# Altium integrated library CB3-ECB.IntLib: 66 symbols
Pins are listed as number, name and electrical type; pins without a type are passive.

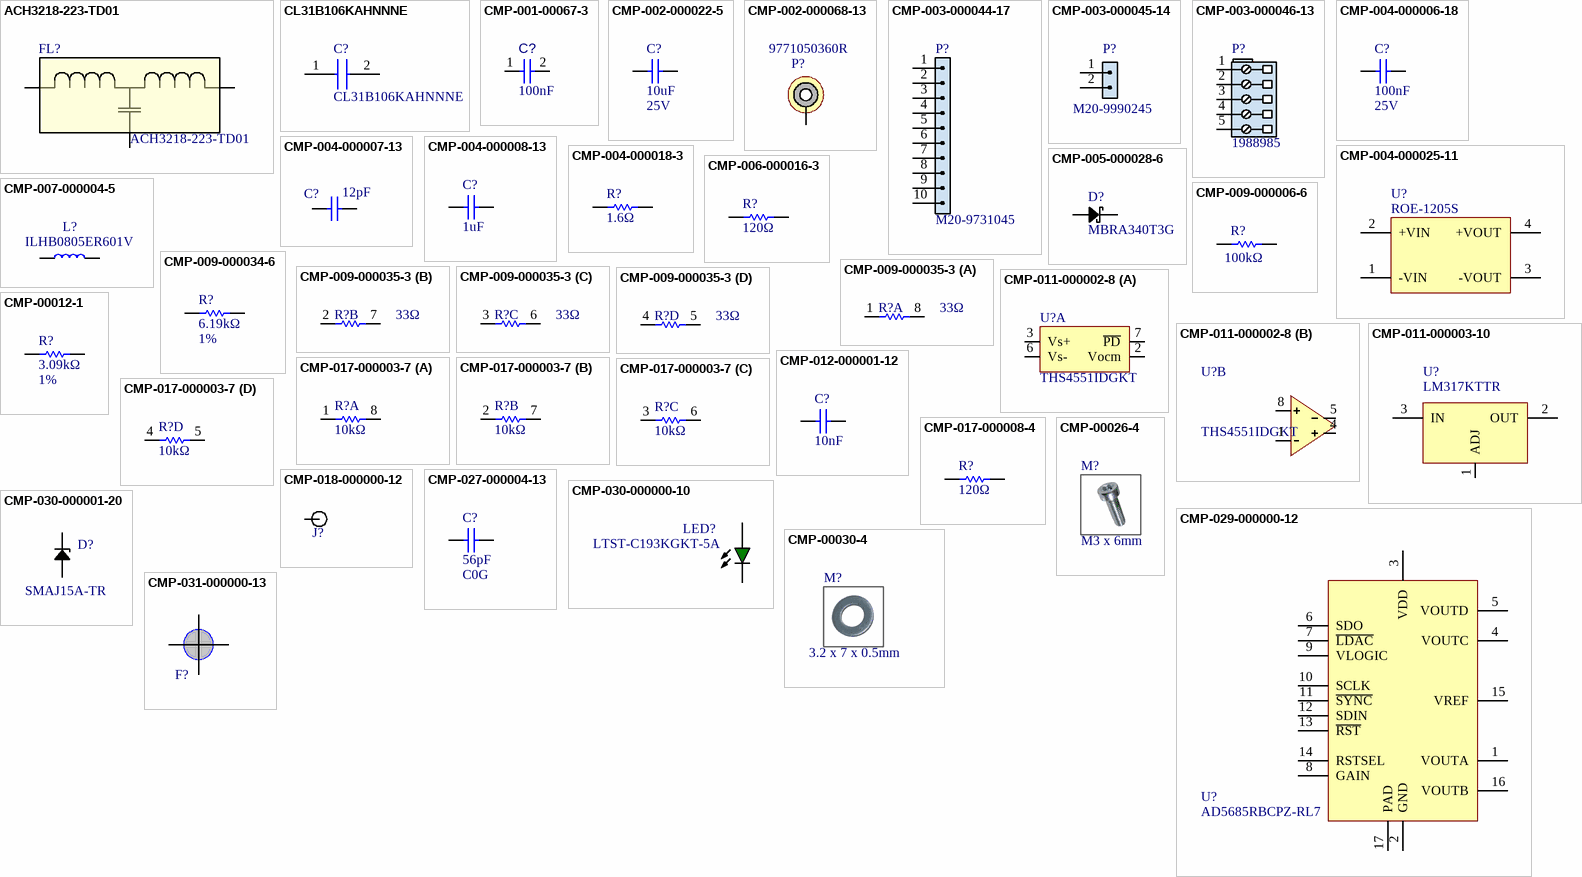
[diagram p0: symbols ACH3218-223-TD01 to CMP-031-000000-13]

## ACH3218-223-TD01
designator FL?
No Description Available; Mfr_Name: TDK
footprint CAP_TDK_ACH3218_TDK
pins: 1, 2 3, 3 2

## CL31B106KAHNNNE
designator C?
Capacitor; Manufacturer_Name: SAMSUNG; Datasheet Link: https://datasheet.datasheetarchive.com/originals/distributors/Datasheets_SAMA/d94547340e0e9d2be5f415b64e4e2f0a.pdf; Height: 1.8mm; Manufacturer_Part_Number: CL31B106KAHNNNE; Mouser Part Number: 187-CL31B106KAHNNNE; Mouser Price/Stock: https://www.mouser.co.uk/ProductDetail/Samsung-Electro-Mechanics/CL31B106KAHNNNE?qs=349EhDEZ59r5EZhnLOTsYA%3D%3D; Arrow Part Number: CL31B106KAHNNNE; Arrow Price/Stock: https://www.arrow.com/en/products/cl31b106kahnnne/samsung-electro-mechanics?region=nac
footprint CAPC3216X180N
pins: 1, 2

## CMP-001-00067-3
designator C?, comment value 100nF  (hidden comment: Capacitor 100nF +/-20% 50V 0402)
Chip Capacitor, 100nF +/-20%, 50V, 0402, Thickness 0.6 mm; Manufacturer: Murata; Manufacturer Part Number: GRM155R61H104JE14D; Manufacturer: Taiyo Yuden; Manufacturer Part Number: UMK105B7104KV-FR; Manufacturer: TDK; Manufacturer Part Number: C1005X7R1H104K; Manufacturer: Yageo; Manufacturer Part Number: CC0402KRX7R9BB104; Manufacturer Part Number: C1005X6S1H104K050BB; Manufacturer Part Number: CC0402KRX5R9BB104; Manufacturer Part Number: C1005X7R1H104K050BB; Manufacturer Part Number: GRM155R71H104KE14D; Manufacturer: Kyocera AVX; Manufacturer Part Number: 04025D104KAT2A; Manufacturer Part Number: GCM155L81E104KE02D; Manufacturer Part Number: C1005X5R1H104K; Tolerance: 10%; Min Operating Temperature: -55°C; Pins: 2; Case/Package: 0402; Max Operating Temperature: 85°C; Voltage Rating: 50V; Mounting Technology: SMT; Component Type: Capacitors
footprint CAPC0402(1005)60_L (Chip Capacitor, Body 1.0x0.5mm, Height 0.6mm, IPC High Density)
pins: 1, 2

## CMP-002-000022-5
designator C?, comment value 10uF  Voltage Rating (DC): 25V  (hidden comment: CAP-10UF-25V-X5R-1206-10%)
CAP CER 10UF 25V X5R 1206 10% (Generic Imperix Component); Tolerance: 10%; Dielectric: X5R; Case/Package: 1206
footprint CAPC3216L(1206) (General 1206 Capacitor Footprint, Body 3.2x1.6mm, IPC High Density)
pins: 1, 2

## CMP-002-000068-13
designator P?, comment 9771050360R
WA-SMSE SMT Steel Spacer, M3x5mm Thread External; Thread Size: M3; Threaded/Unthreaded: Threaded; Outside Diameter: 0.236inch; Plating: Tin; Body Length: 5mm; Mounting Technology: External; Length: 0.433inch; Material: Steel; Series: WA-SMSE; Reach SVHC Compliant: Unknown; Width: 6mm
footprint 9771050360R (WA-SMSE SMT Steel Spacer, M3 Thread External)
pins: 0

## CMP-003-000044-17
designator P?, comment M20-9731045
Connector Header Through Hole 10 position 0.100" (2.54mm); Mated Stacking Heights: 16.54mm; Current Rating: 3A; Number of Positions: 10; Voltage Rating: 750V; Gender: Male; Pitch: 2.54mm; Contact Shape: Square; Housing Material: Nylon; Max Operating Temperature: 105°C; Contact Plating: Gold; Termination: Solder; Contact Material: Brass; Contact Type: Male Pin; Contact Finish - Mating: GOLD; Packaging: Bulk; Number of Rows: 1; Insulation Material: Nylon; Radiation Hardening: No; Flammability Rating: UL94 V-0; Fastening Type: Pull; Min Operating Temperature: -40°C; Number of Contacts: 10; Package Quantity: 500; Insulation Color: Black; RoHS Compliant: Yes; Series: M20; Mounting Technology: Through Hole
footprint M20-9731045 (Connector Header Through Hole 10 position 0.100" (2.54mm))
pins: 1, 2, 3, 4, 5, 6, 7, 8, 9, 10

## CMP-003-000045-14
designator P?, comment M20-9990245
Connector Header Through Hole 2 position 0.100" (2.54mm); Working Voltage: 750V; Gender: Male; Number of Positions: 2; Insulation Resistance: 10GR; Contact Resistance: 25mR; Mated Stacking Heights: 16.54mm; Current Rating: 3A; Mating Cycles: 300; Voltage: 50V; Housing Color: Black; Reach SVHC Compliant: No; Packaging: Bulk; Radiation Hardening: No; Min Operating Temperature: -40°C; Package Quantity: 1000; Series: M20; Housing Material: Nylon; Contact Finish - Mating: GOLD; Contact Material: Brass,Bronze; Length: 5.08mm; Max Current Rating: 3A; Current: 3A; Flammability Rating: UL94 V-0; Fastening Type: Pull; Depth: 2.54mm; Orientation: Straight; Contact Type: Male Pin; Number of Rows: 1; Number of Poles: 2; Voltage Rating (DC): 750V; Lead Pitch: 2.54mm; Mounting Technology: Through Hole; Contact Plating: Gold; Max Operating Temperature: 105°C; Voltage Rating (AC): 750V; Termination: Solder; Insulation Color: Black; Number of Contacts: 2; Contact Shape: Square; Pitch: 2.54mm; Insulation Material: Nylon
footprint M20-9990245 (Connector Header Through Hole 2 position 0.100" (2.54mm))
pins: 1, 2

## CMP-003-000046-13
designator P?, comment 1988985
Conn PC Terminal Block 5 POS 3.5mm Solder Thru-Hole 17.5A; Number of Poles: 5; Voltage: 300V; Current: 10A; Approvals: UL,EAC; Number of Levels: 1; Wire Gauge (Max): 26AWG; Gender: Male; Wire Gauge (Min): 16AWG; Voltage Rating: 160V; Number of Rows: 1; Mounting Technology: Through Hole; Lead Free: Lead Free; Color: Green; Number of Positions: 5; Orientation: Straight; Weight: 0.086068oz; Max Current Rating: 17.5A; Number of Circuits: 5; Number of Positions Per Level: 5; Packaging: Bulk; Pitch: 3.5mm; Current Rating: 17.5A; Material: Polyamide; Series: COMBICON PTA; Length: 11.2mm; Pins: 5; Height: 13.7mm; Housing Material: Nylon; Number of Contacts: 5; Contact Material: Tin; RoHS Compliant: Yes; Width: 17.5mm; Depth: 9.9mm; Housing Color: Green; Package Quantity: 100; Termination: Screw; Flammability Rating: UL94 V-0
footprint 1988985 (Conn PC Terminal Block 5 POS 3.5mm Solder Thru-Hole 17.5A)
pins: 1, 2, 3, 4, 5

## CMP-004-000006-18
designator C?, comment value 100nF  Voltage Rating (DC): 25V  (hidden comment: CAP-100NF-25V-X7R-0402-10%)
CAP CER 100NF 25V X7R 0402 10% (Generic Imperix Component); Tolerance: 10%; Case/Package: 0402; Dielectric: X7R
footprint CAPC1005L(0402) (General 0402 Capacitor Footprint, Body 1.0x0.5mm, IPC High Density)
pins: 1, 2

## CMP-004-000007-13
designator C?, comment value 12pF  (hidden comment: CAP-12PF-50V-C0G-0402-5%)
CAP CER 12PF 50V C0G 0402 5% (Generic Imperix Component); Tolerance: 5%; Case/Package: 0402; Dielectric: C0G; Voltage Rating (DC): 50V
footprint CAPC1005L(0402) (General 0402 Capacitor Footprint, Body 1.0x0.5mm, IPC High Density)
pins: 1, 2

## CMP-004-000008-13
designator C?, comment value 1uF  (hidden comment: CAP-1UF-6.3V-X5R-0402-5%)
CAP CER 1UF 6.3V X5R 0402 5% (Generic Imperix Component); Tolerance: 5%; Case/Package: 0402; Dielectric: X5R; Voltage Rating (DC): 6.3V
footprint CAPC1005L(0402) (General 0402 Capacitor Footprint, Body 1.0x0.5mm, IPC High Density)
pins: 1, 2

## CMP-004-000018-3
designator R?, comment value 1.6Ω  (hidden comment: RES-1.6Ω-1/16WW-200PPM-0402-5%)
RES SMD 1.6Ω 1/16WW 200PPM 0402 5% (Generic Imperix Component); Temperature Coefficient: 200ppm/°C; Power Rating: 1/16W; Tolerance: 5%; Case/Package: 0402
footprint RESC1005L(0402) (General 0402 Resistor Footprint, Body 1.1x0.5mm, IPC High Density)
pins: 1, 2

## CMP-004-000025-11
designator U?, comment ROE-1205S
Isolated Module DC DC Converter 1 Output 5V 200mA 10.8V - 13.2V Input; Isolation Voltage: 1kV; Efficiency: 80%; Number of Outputs: 1; Max Power Dissipation: 1W; Max Output current: 200mA; Series: ECONOLINE ROE (E-Series) (1W); RoHS Compliant: Yes; Max Operating Temperature: 85°C; Packaging: Rail/Tube; Voltage - Output 1: 5V; Min Input Voltage: 10.8V; Length: 11.5mm; Max Output Voltage: 5V; Min Operating Temperature: -40°C; Max Supply Voltage: 13.2V; Width: 6mm; Height: 10mm; Mounting Technology: Through Hole; Lead Free: Lead Free; Weight: 1.4g
footprint ROE (RECOM DC/DC Converter Series - ROE Series Footprint)
pins: 1 -VIN (power), 2 +VIN (power), 3 -VOUT (power), 4 +VOUT (power)

## CMP-005-000028-6
designator D?, comment MBRA340T3G
Diode Schottky 40 V 3A Surface Mount SMA; Max Forward Surge Current (Ifsm): 100A; Max Repetitive Reverse Voltage (Vrrm): 40V; Polarity: Standard; Element Configuration: Single; Forward Voltage: 450mV; Max Reverse Current: 300uA; Max Operating Temperature: 150°C; Radiation Hardening: No; Length: 4.32mm; Reach SVHC Compliant: No; Pins: 2; Package Quantity: 1; Voltage Rating (DC): 40V; RoHS Compliant: Yes; Halogen Free: Halogen Free; Series: -; Current Rating: 3A; Case/Package: DO-214AC; Height: 2mm; Min Operating Temperature: -55°C; Lead Free: Lead Free; Peak Non-Repetitive Surge Current: 100A; Max Reverse Voltage (DC): 40V; Output Current: 3A; Width: 2.6mm; Packaging: Tape and Reel; Forward Current: 3A; Average Rectified Current: 3A
footprint DO-214AC (General DO-214AC/SMA Diode Footprint; 2 C-Bend Leads; Body 5.0 x 2.7 mm, inc. leads (LxW))
pins: A, K

## CMP-006-000016-3
designator R?, comment value 120Ω  (hidden comment: RES-120Ω-1/8W-50PPM-0603-1%)
RES SMD 120Ω 1/8W 50PPM 0603 1% (Generic Imperix Component); Temperature Coefficient: 50ppm/°C; Tolerance: 1%; Case/Package: 0603; Power Rating: 1/8W
footprint RESC1608L(0603) (General 0603 Resistor Footprint, Body 1.6x0.8mm, IPC High Density)
pins: 1, 2

## CMP-007-000004-5
designator L?, comment ILHB0805ER601V
Ferrite Beads Multi-Layer High Current 600Ohm 25% 100MHz 2A 100mOhm DCR 0805 T/R; DC Resistance (DCR): 100mR; Impedance: 600R; Number of Lines: 1; Shielding: Shielded; Value: 600Ω 2A; Case/Package: 0805; Case Code (Imperial): 0805; Case Code (Metric): 2012; Core Material: Ferrite; Current Rating: 2A; DC Current: 2A; Depth: 1.45mm; Height: 0.043inch; Lead Free: Lead Free; Length: 0.079inch; Max Current Rating: 2A; Max DC Current: 2A; Max Operating Temperature: 125°C; Military Standard: Not; Min Operating Temperature: -55°C; Mounting Technology: Surface Mount; Package Quantity: 4000; Packaging: Tape and Reel; Pins: 2; Radiation Hardening: No; Reach SVHC Compliant: Unknown; RoHS Compliant: Yes; Self Resonant Frequency: 100MHz; Series: ILHB; Termination: SMD/SMT; Test Frequency: 100MHz; Tolerance: 25%; Width: 1.25mm
footprint RESC2012L(0805) (General 0805 Resistor Footprint, Body 2.0x1.3mm, IPC High Density)
pins: 1, 2

## CMP-009-000006-6
designator R?, comment value 100kΩ  (hidden comment: RES-100KΩ-1/16W-100PPM-0402-1%)
RES SMD 100KΩ 1/16W 100PPM 0402 1% (Generic Imperix Component); Temperature Coefficient: 100ppm/°C; Case/Package: 0402; Power Rating: 1/16W; Tolerance: 1%
footprint RESC1005L(0402) (General 0402 Resistor Footprint, Body 1.1x0.5mm, IPC High Density)
pins: 1, 2

## CMP-009-000034-6
designator R?, comment value 6.19kΩ  Tolerance: 1%  (hidden comment: RES-6.19KΩ-1/16W-100PPM-0402-1%)
RES SMD 6.19KΩ 1/16W 100PPM 0402 1% (Generic Imperix Component); Temperature Coefficient: 100ppm/°C; Power Rating: 1/16W; Case/Package: 0402
footprint RESC1005L(0402) (General 0402 Resistor Footprint, Body 1.1x0.5mm, IPC High Density)
pins: 1, 2

## CMP-009-000035-3
designator R?, comment value 33Ω  (hidden comment: EXB-28V330JX)
Res Thick Film Array 33 Ohm 5% ±200ppm/°C ISOL 8-Pin 0804(4 X 0402) Convex SMD Automotive T/R; Power Rating: 62.5mW; Voltage Rating (DC): 100V; Circuit Type: Isolated; Power Dissipation: 63mW; Number of Elements: 4; Number of Contacts: 8; Voltage Rating: 50V; Tolerance: 5%; Pins: 8; Resistance Tolerance: 5%; Series: EXB; Min Operating Temperature: -55°C; Height: 0.35mm; Temperature Coefficient: 200ppm/°C; Length: 2mm; Package Quantity: 10000; Width: 1mm; Reach SVHC Compliant: No; Power Per Element: 62.5mW; Technology: THICK FILM; Termination: Convex; RoHS Compliant: Yes; Packaging: Tape and Reel; Case Code (Metric): 1005; Max Operating Temperature: 125°C; Lead Free: Lead Free; Case/Package: 0804; Mounting Technology: Surface Mount; Radiation Hardening: No; Military Standard: Not; Number of Resistors: 4; Depth: 1mm; Case Code (Imperial): 0402; Terminal Pitch: 0.5mm
footprint RESQUAD0804 (General 0804 Quad Resisor Array Footprint, Body 2.0x1.2mm)
part A pins: 1, 8
part B pins: 2, 7
part C pins: 3, 6
part D pins: 4, 5

## CMP-011-000002-8
designator U?, comment THS4551IDGKT
Low Noise, Precision, 150MHz, Fully Differential Amplifier 8-TSOP -40 to 125; Bandwidth: 135MHz; Slew Rate: 220V/µs; Operating Supply Current: 1.35mA; Number of Circuits: 1; Input Offset Voltage (Vos): 50uV; Input Bias Current: 1uA; Lead Free: Lead Free; -3db Bandwidth: 150MHz; Series: -; Min Operating Temperature: -40°C; Max Operating Temperature: 125°C; Gain Bandwidth Product: 135MHz; Number of Amplifiers: 1; RoHS Compliant: Yes; Number of Channels: 1; Case/Package: TSOP-8; Packaging: Cut Tape; Pins: 8; Mounting Technology: Surface Mount; Reach SVHC Compliant: No; Amplifier Type: DIFFERENTIAL
footprint TSOP65P490-8AL (General TSOP Footprint, 8-Leads, Body 3.00x3.00mm, Pitch 0.65mm, IPC High Density)
part A pins: 2 Vocm, 3 Vs+, 6 Vs-, 7 ~{PD}
part B pins: 1 -, 4 +, 5 -, 8 +

## CMP-011-000003-10
designator U?, comment LM317KTTR
IC REG LINEAR ADJ 1.5A DDPAK; Number of Regulators: 1; Dropout Voltage: 2V; Polarity: Positive; Output Type: Adjustable; Quiescent Current: 3.5mA; Max Supply Voltage: 40V; Power Supply Rejection Ratio (PSRR): 64dB; Min Output Voltage: 1.25V; Reference Voltage: 1.3V; Output Voltage: 37V; Min Input Voltage: 4.2V; Length: 10.18mm; Pins: 3; Output Current: 1.5A; Max Operating Temperature: 125°C; Package Quantity: 1; Mounting Technology: Surface Mount; Packaging: Tape and Reel; Series: LM317; Min Operating Temperature: 0°C; Reach SVHC Compliant: No; Max Output current: 1.5A; Weight: 0.050897oz; Number of Outputs: 1; Width: 8.41mm; Lead Free: Lead Free; Case/Package: TO263-3; Max Output Voltage: 37V; Height: 4.44mm; RoHS Compliant: Yes
footprint TO263-3 (General TO263-3 Footprint, 3-Leads, Body 10.00x15.00mm, Pitch 2.54mm (D2PAK))
pins: 1 ADJ, 2 OUT, 3 IN

## CMP-00012-1
designator R?, comment value 3.09kΩ  Tolerance: 1%  (hidden comment: RES-3.09KΩ-1/16W-100PPM-0402-1%)
RES SMD 3.09KΩ 1/16W 100PPM 0402 1% (Generic Imperix Component); Temperature Coefficient: 100ppm/°C; Power Rating: 1/16W; Case/Package: 0402
footprint RESC1005L(0402) (General 0402 Resistor Footprint, Body 1.1x0.5mm, IPC High Density)
pins: 1, 2

## CMP-012-000001-12
designator C?, comment value 10nF  (hidden comment: CAP-10NF-25V-X7R-0402-10%)
CAP CER 10NF 25V X7R 0402 10% (Generic Imperix Component); Tolerance: 10%; Case/Package: 0402; Voltage Rating (DC): 25V; Dielectric: X7R
footprint CAPC1005L(0402) (General 0402 Capacitor Footprint, Body 1.0x0.5mm, IPC High Density)
pins: 1, 2

## CMP-017-000003-7
designator R?, comment value 10kΩ  (hidden comment: ACASA1002S1002P100)
10k Ohm ±0.1% 100mW Power Per Element Isolated 4 Resistor Network/Array ±25ppm/°C 1206 (3216 Metric), Convex, Long Side Terminals; Number of Resistors: 4; Tolerance Relative: 0.05%; Tolerance: 0.1%; Case/Package: 1206; Case Code (Imperial): 1206; Case Code (Metric): 3216; Circuit Type: Isolated; Lead Free: Lead Free; Max Operating Temperature: 125°C; Min Operating Temperature: -55°C; Mounting Technology: Surface Mount; Packaging: Cut Tape; Pins: 8; Power Per Element: 100mW; Power Rating: 100mW; RoHS Compliant: Yes; Series: ACA - Precision; Temperature Coefficient: 25ppm/°C
footprint RESQUAD1206 (General 1206 Quad Resisor Array Footprint, Body 3.2x1.6mm)
part A pins: 1, 8
part B pins: 2, 7
part C pins: 3, 6
part D pins: 4, 5

## CMP-017-000008-4
designator R?, comment value 120Ω  (hidden comment: RES-120Ω-1/16W-25PPM-0402-0.1%)
RES SMD 120Ω 1/16W 25PPM 0402 0.1% (Generic Imperix Component); Temperature Coefficient: 25ppm/°C; Tolerance: 0.1%; Power Rating: 1/16W; Case/Package: 0402
footprint RESC1005L(0402) (General 0402 Resistor Footprint, Body 1.1x0.5mm, IPC High Density)
pins: 1, 2

## CMP-018-000000-12
designator J?, comment 1625854-1  (value not drawn)
Natural PC Test Point Plating Surface Mount Mounting Type; Color: Natural; Packaging: Tape and Reel; Package Quantity: 2000; Max Operating Temperature: 125°C; Series: RC, CGS; Radiation Hardening: No; RoHS Compliant: Yes; Min Operating Temperature: -55°C; Case/Package: 1206; Mounting Technology: Surface Mount
footprint TP-3216L(1206) (General 1206 Testpoint Footprint, 3.2x1.6mm, IPC High Density)
pins: 1 TP

## CMP-00026-4
designator M?, comment value M3 x 6mm  (hidden comment: 1145924)  (mechanical)
Hexalobular (6 Lobe) socket head cap M3x6mm screws with low head, fully threaded; Thread size: M3; Length: 6mm

## CMP-027-000004-13
designator C?, comment value 56pF  Dielectric: C0G  (hidden comment: CAP-56PF-50V-C0G-0402-1%)
CAP CER 56PF 50V C0G 0402 1% (Generic Imperix Component); Tolerance: 1%; Case/Package: 0402; Voltage Rating (DC): 50V
footprint CAPC1005L(0402) (General 0402 Capacitor Footprint, Body 1.0x0.5mm, IPC High Density)
pins: 1, 2

## CMP-029-000000-12
designator U?, comment AD5685RBCPZ-RL7
DAC 4-CH Resistor-String 14-bit 16-Pin LFCSP EP T/R; Supply Type: Analog,Digital; Settling Time: 5us; Number of Converters: 4; Min Output Voltage: 2.7V; Min Input Voltage: 750mV; Sampling Rate: 25MS/s; Signal to Noise Ratio (SNR): 90dB; Power Dissipation: 7.15mW; Output Type: Voltage; Differential Output: No; Max Output Voltage: 5.5V; Supply Current: 1.1mA; Output Polarity: Unipolar; Integral Nonlinearity (INL): 1LSB; Interface: SPI,Serial; Resolution: 14b; Number of Bits: 14; Slew Rate: 0.8V/µs; Reach SVHC Compliant: No; Case/Package: QFN-16; Min Operating Temperature: -40°C; Series: nanoDAC+™; Contact Plating: Tin,Matte; Max Operating Temperature: 105°C; Min Supply Voltage: 2.7V; Number of DAC Channels: 4; Max Supply Voltage: 5.5V; RoHS Compliant: Yes; Package Quantity: 1500; Packaging: Tape and Reel; Lead Free: Contains Lead; Pins: 16; Number of D/A Converters: 4; Conversion Rate: 25MS/s
footprint QFN50P300X300-16WAL (General QFN Footprint, 16-Leads, Body 3.00x3.00mm, Pitch 0.50mm, Thermal Pad 1.60x1.60mm, IPC High Density)
pins: 1 VOUTA, 2 GND, 3 VDD, 4 VOUTC, 5 VOUTD, 6 SDO, 7 ~{LDAC}, 8 GAIN, 9 VLOGIC, 10 SCLK, 11 ~{SYNC}, 12 SDIN, 13 ~{RST}, 14 RSTSEL, 15 VREF, 16 VOUTB, 17 PAD

## CMP-030-000000-10
designator LED?, comment LTST-C193KGKT-5A
LED GREEN CLEAR 0603 SMD; Lens Size: 0.8mm; Lens Color: Colorless; Illumination Color: Green,Yellow; Dominant Wavelength: 576.5nm; Test Current: 5mA; Luminous Intensity: 28mcd; Power Dissipation: 75mW; Lens Style: Flat,Diffused,Colorless,Rectangular,Clear; Forward Voltage: 2.3V; Reverse Voltage: 5V; Viewing Angle: 130°; Number of Elements: 1; Forward Current: 30mA; Radiation Hardening: No; RoHS Compliant: Yes; Series: -; Case/Package: 0603; Depth: 0.8mm; Min Operating Temperature: -55°C; Height: 0.45mm; Mounting Technology: Surface Mount; Lens Transparency: Clear; Case Code (Metric): 1608; Pins: 2; Lead Free: Lead Free; Color: Green; Power Rating: 75mW; Packaging: Tape and Reel; Case Code (Imperial): 0603; Package Quantity: 3000; Max Operating Temperature: 85°C; Length: 1.6mm; Number of LEDs: 1; Width: 0.8mm
footprint LED0603_GREEN (General LED (green) 0603 Footprint)
pins: A, K

## CMP-030-000001-20
designator D?, comment SMAJ15A-TR
32.5V Clamp 71A (8/20µs) Ipp Tvs Diode Surface Mount SMA (DO-214AC) Unidirectional; Voltage Rating (DC): 15V; Leakage Current: 200nA; Max Breakdown Voltage: 17.6V; Value: 975pF; Min Breakdown Voltage: 16.7V; Number of Elements: 1; Diode Type: ZENER; Power Line Protection: No; Power Dissipation: 400W; ESD Protection: Yes; Test Current: 1mA; Min Operating Temperature: -55°C; Height: 2.03mm; Max Reverse Leakage Current: 200nA; Breakdown Voltage: 17.6V; Max Operating Temperature: 150°C; Clamping Voltage-Max: 32.5V; Lead Free: Lead Free; Clamping Voltage: 32.5V; Polarity: Unidirectional; Reach SVHC Compliant: No; Width: 4.6mm; RoHS Compliant: Yes; Radiation Hardening: No; Case/Package: DO-214AC; Mounting Technology: Surface Mount; Direction: Unidirectional; Pins: 2; Package Quantity: 1; Peak Pulse Power: 400W; Series: SMAJ, TRANSIL™; Reverse Breakdown Voltage: 16.7V; Reverse Standoff Voltage: 15V; Operating Supply Voltage: 15V; Length: 2.95mm; Max Surge Current: 1mA; Packaging: Tape and Reel; Peak Pulse Current: 71A; Number of Unidirectional Channels: 1; Termination: SMD/SMT
footprint DO-214AC (General DO-214AC/SMA Diode Footprint; 2 C-Bend Leads; Body 5.0 x 2.7 mm, inc. leads (LxW))
pins: A, K

## CMP-00030-4
designator M?, comment value 3.2 x 7 x 0.5mm  (hidden comment: 1887467)  (mechanical)
Flat washers M3 without chamfer

## CMP-031-000000-13
designator F?, comment Fiducial  (value not drawn)  (no BOM)
Fiducial for pick&place (No BOM)
footprint Fiducial050 (Fiducial for pick&place, Diameter 0.5mm)
footprint Fiducial100 (Fiducial for pick&place, Diameter 1.0mm)

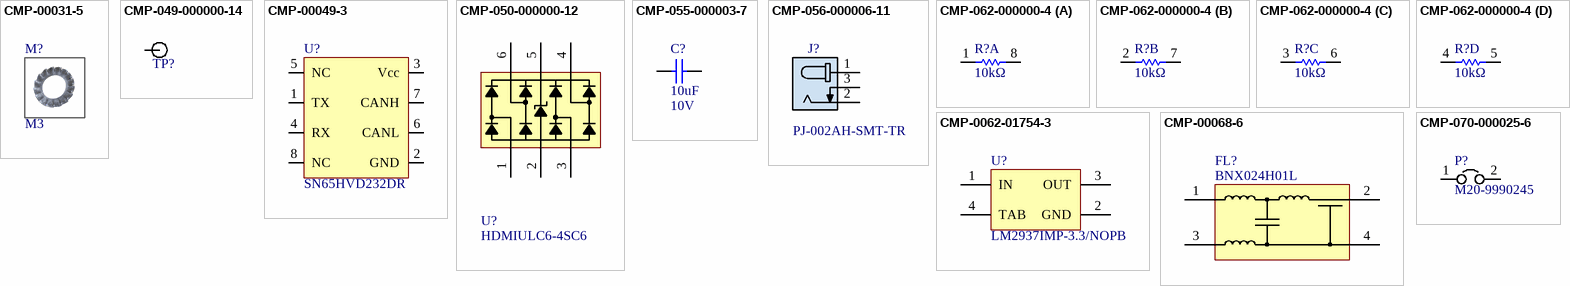
[diagram p1: symbols CMP-00031-5 to CMP-070-000025-6]

## CMP-00031-5
designator M?, comment value M3  (hidden comment: 1278037)  (mechanical)
Serrated M3 lock washers type A, external serrations

## CMP-049-000000-14
designator TP?, comment 5001  (value not drawn)
Black PC Test Point, Miniature Phosphor Bronze Silver Plating Through Hole Mounting Type; Inside Diameter: 1.27mm; Hole Diameter: 1.6mm; Outside Diameter: 2.54mm; Number of Contacts: 1; Insulation: Insulated; Contact Material: Bronze; Material: Nylon,Bronze,Silver; Mounting Technology: Through Hole; Series: THM; Reach SVHC Compliant: No; Length: 7.62mm; Body Material: Bronze; Lead Free: Lead Free; Packaging: Bulk; Package Quantity: 100; Contact Plating: Tin,Silver; Color: Black; RoHS Compliant: Yes; Insulation Material: Nylon; Housing Color: Black; Orientation: Straight; Diameter: 2.54mm; Termination: Through Hole; Number of Ports: 1; Plating: Silver
footprint 5001 (Black PC Test Point, Miniature Phosphor Bronze Silver Plating Through Hole Mounting Type)
pins: 1 TP

## CMP-00049-3
designator U?, comment SN65HVD232DR
Texas Instruments - SN65HVD232DR - Can Transceiver, 1MBPS, 1/1, 3.3V, SOIC-8, Full Reel; Number of Receive Buffers: 1; Min Supply Voltage: 3V; Max Supply Voltage: 3.6V; Simplex/Duplex: Half Duplex; Supply Current: 17mA; Receiver Hysteresis: 100mV; Weight: 0.002561oz; Radiation Hardening: No; RoHS Compliant: Yes; Series: -; Pins: 8; Data Rate: 1Mbps; Package Quantity: 2500; Max Operating Temperature: 85°C; Reach SVHC Compliant: No; Case/Package: SOIC-8; Number of Receivers: 1; Number of Transmit Buffers: 1; Number of Drivers: 1; Lead Free: Lead Free; Min Operating Temperature: -40°C; Number of Transceivers: 1; Packaging: Tape and Reel
footprint SOIC127P600-8AL (General SOIC Footprint, 8-Leads, Body 4.90x3.90mm, Pitch 1.27mm, IPC High Density)
pins: 1 TX, 2 GND, 3 Vcc, 4 RX, 5 NC, 6 CANL, 7 CANH, 8 NC

## CMP-050-000000-12
designator U?, comment HDMIULC6-4SC6
HDMIULC6 Series 4 Channel 6 V Bi-Directional ESD Protection - SOT-23-6; Breakdown Voltage: 6V; Clamping Voltage-Max: 17V; Direction: Unidirectional,Bidirectional; ESD Protection: Yes; Leakage Current: 500nA; Number of Bidirectional Channels: 4; Number of Elements: 1; Operating Supply Voltage: 5V; Peak Pulse Current: 5A; Polarity: Bidirectional,Unidirectional; Test Current: 1mA; Value: 1pF; Case/Package: SOT23-6; Clamping Voltage: 17V; Depth: 1.75mm; Height: 1.3mm; Lead Free: Lead Free; Length: 3.05mm; Max Breakdown Voltage: 6V; Max Operating Temperature: 125°C; Max Reverse Leakage Current: 500nA; Min Breakdown Voltage: 6V; Min Operating Temperature: -55°C; Mounting Technology: Surface Mount; Number of Channels: 4; Number of Unidirectional Channels: 4; Package Quantity: 1; Packaging: Tape and Reel; Pins: 6; Power Line Protection: Yes; Radiation Hardening: No; Reach SVHC Compliant: No; Reverse Breakdown Voltage: 6V; Reverse Standoff Voltage: 5V; RoHS Compliant: Yes; Series: HDMI; Termination: SMD/SMT; Voltage Rating (DC): 6V; Width: 1.75mm; Working Voltage: 5V
footprint SOT23-6N (General SOT23-6 Footprint, 6-Leads, Body 2.90x2.90mm, Pitch 0.95mm, IPC Medium Density)
pins: 1, 2, 3, 4, 5, 6

## CMP-055-000003-7
designator C?, comment value 10uF  Voltage Rating (DC): 10V  (hidden comment: CAP-10UF-10V-X5R-0603-10%)
CAP CER 10UF 10V X5R 0603 10% (Generic Imperix Component); Tolerance: 10%; Dielectric: X5R; Case/Package: 0603
footprint CAPC1608L(0603) (General 0603 Capacitor Footprint, Body 1.6x0.8mm, IPC High Density)
pins: 1, 2

## CMP-056-000006-11
designator J?, comment PJ-002AH-SMT-TR
2.0 x 6.5 mm, 5.0 A, Horizontal, Surface Mount (SMT), Dc Power Jack Connector; Body Color: Black; Gender: Male; Shielding: Unshielded; Connector Type: Jack; Contact Material: Brass; Contact Plating: Nickel; Flammability Rating: UL94 V-0; Housing Material: Nylon; Max Operating Temperature: 85°C; Min Operating Temperature: -25°C; Mounting Technology: Surface Mount; Termination: Solder
footprint PJ-002AH-SMT-TR (2.0 x 6.5 mm, 5.0 A, Horizontal, Surface Mount (SMT), Dc Power Jack Connector)
pins: 1, 2, 3
